# Altium footprint library cat.PcbLib: 78 footprints (part 1 of 5)
Each footprint in its own frame and in the unit in brackets; x right, y up, seen from the top. Pads: shape width x height; smd on the part's side, far side on the other; paste and mask are expansions set on the pad; w line width, h text height; cw(c..) or ccw(c..) is an arc to the next point about the centre after c.
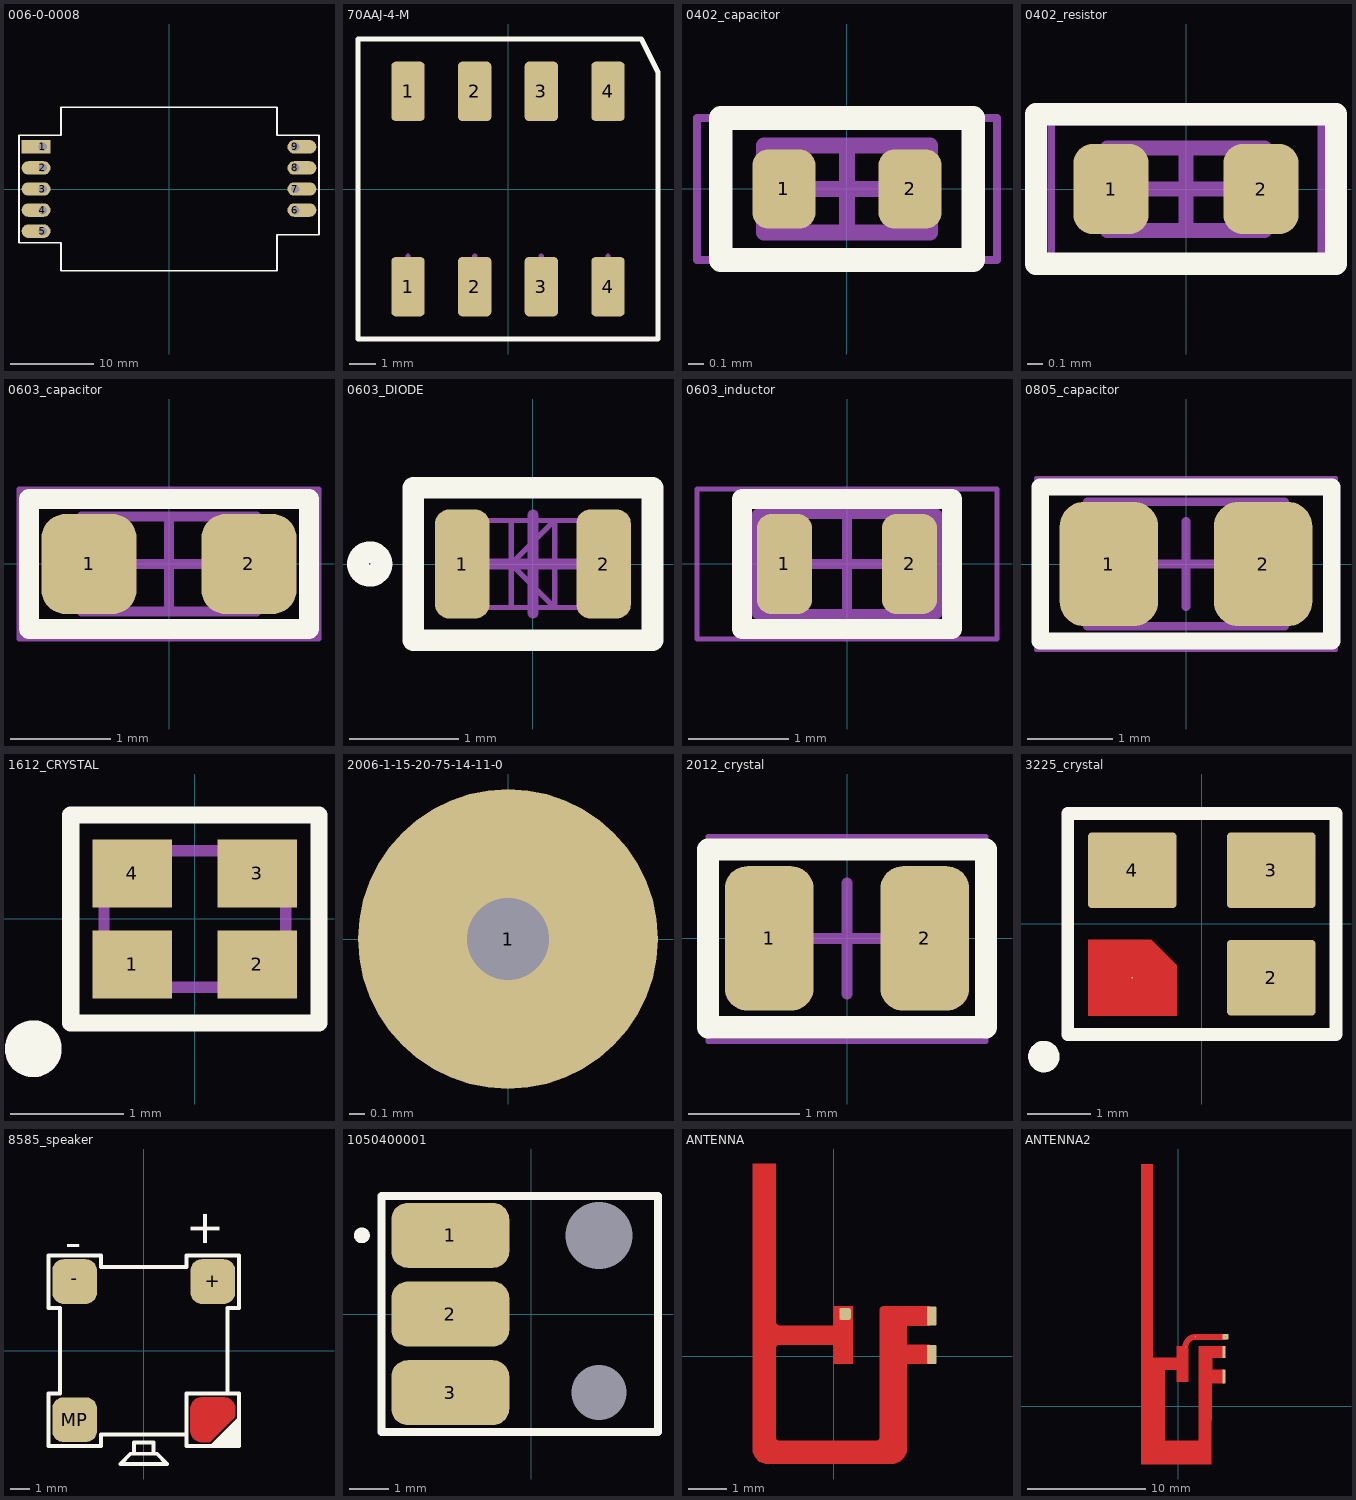
[diagram p0: the footprints below, top view; thin cyan lines are the x and y axes]

## 006-0-0008 [mm] "Sunrise CO2 sensor"
pads (9):
  rect 3.5x1.62 hole 1.02 copper offset -0.8,0: 1(-15.24,5.08)
  oval 3.5x1.62 hole 1.02 copper offset -0.8,0: 2(-15.24,2.54) 3(-15.24,0) 4(-15.24,-2.54) 5(-15.24,-5.08)
  oval 3.5x1.62 hole 1.02 copper offset 0.8,0: 6(15.24,-2.54) 7(15.24,0) 8(15.24,2.54) 9(15.24,5.08)
Top Overlay:
  lines w0.2: -18.1,-6.5 -18.1,6.5 -13.025,6.5 -13.025,9.85 13.025,9.85 13.025,6.5 18.1,6.5 18.1,-5.5 13.025,-5.5 13.025,-9.85 -13.025,-9.85 -13.025,-6.5 -18.1,-6.5
3D body "006-0-0008_co2_sensor.step": height 14.02, standoff 2.54, extent -17.04,-9.852 16.5,9.853
3D body "4-pin_header.step": height 9.95, standoff -1.59, extent 13.97,-3.81 16.51,6.35
3D body "5-pin_header.step": height 9.95, standoff -1.59, extent -16.51,-6.35 -13.97,6.35

## 70AAJ-4-M [mm]
pads (8):
  rrect25% 1.27x2.26 smd: 1(-3.81,-3.72) 1(-3.81,3.72) 2(-1.27,-3.72) 2(-1.27,3.72) 3(1.27,-3.72) 3(1.27,3.72) 4(3.81,-3.72) 4(3.81,3.72)
Top Overlay:
  lines w0.2: -5.715,-5.715 5.715,-5.715 5.715,4.445 5.08,5.715 -5.715,5.715 -5.715,-5.715
Mechanical 15:
  lines w0.2: -4.31,-3.048 -3.31,-3.048 ; -3.81,-3.548 -3.81,-2.548 ; -1.77,-3.048 -0.77,-3.048 ; -1.27,-3.548 -1.27,-2.548 ; 0.77,-3.048 1.77,-3.048 ; 1.27,-3.548 1.27,-2.548 ; 3.31,-3.048 4.31,-3.048 ; 3.81,-3.548 3.81,-2.548
3D body "70aaj-4-m0.stp": height 4.03, standoff 0.05, extent -5.042,-4.224 5.042,4.26

## 0402_capacitor [mm] "0402 chip capacitor"
height 0.55
pads (2):
  rrect50% 0.4x0.5 smd: 1(-0.4,0) 2(0.4,0)
Top Overlay:
  lines w0.15: -0.8,-0.45 -0.8,0.45 0.8,0.45 0.8,-0.45 -0.8,-0.45
Mechanical 13:
  lines w0.1: -0.525,-0.275 -0.525,0.275 0.525,0.275 0.525,-0.275 -0.525,-0.275
Mechanical 15:
  lines w0.05: -0.95,-0.45 -0.95,0.45 0.95,0.45 0.95,-0.45 -0.95,-0.45
  lines w0.1: -0.275,0 0.275,0 ; 0,-0.275 0,0.275
3D body "0402_capacitor.step": height 0.55, standoff 0, extent -0.525,-0.275 0.525,0.275

## 0402_resistor [mm] "Chip Resistor, 2-Leads, Body 1.00x0.50mm, IPC Medium Density"
height 0.4
pads (2):
  rrect50% 0.5x0.6 smd: 1(-0.5,0) 2(0.5,0)
Top Overlay:
  lines w0.15: -1,-0.5 -1,0.5 1,0.5 1,-0.5 -1,-0.5
Mechanical 13:
  lines w0.1: -0.525,-0.275 0.525,-0.275 0.525,0.275 -0.525,0.275 -0.525,-0.275
Mechanical 15:
  lines w0.05: -0.9,-0.45 0.9,-0.45 0.9,0.45 -0.9,0.45 -0.9,-0.45
  lines w0.1: -0.275,0 0.275,0 ; 0,-0.275 0,0.275
3D body "0402_resistor_fix.step": height 0.4, standoff 0, extent -0.525,-0.275 0.525,0.275

## 0603_capacitor [mm] "Chip Capacitor, 2-Leads, Body 1.60x0.80mm, IPC Medium Density"
height 0.87
pads (2):
  rrect50% 0.95x1 smd: 1(-0.8,0) 2(0.8,0)
Top Overlay:
  lines w0.2: -1.4,-0.65 -1.4,0.65 1.4,0.65 1.4,-0.65 -1.4,-0.65
Mechanical 13:
  lines w0.1: -0.875,-0.475 0.875,-0.475 0.875,0.475 -0.875,0.475 -0.875,-0.475
Mechanical 15:
  lines w0.05: -1.5,-0.75 1.5,-0.75 1.5,0.75 -1.5,0.75 -1.5,-0.75
  lines w0.1: -0.475,0 0.475,0 ; 0,-0.475 0,0.475
3D body "0603_capacitor.step": height 0.87, standoff 0, extent -0.875,-0.475 0.875,0.475

## 0603_DIODE [mm]
height 0.75
pads (2):
  rrect50% 0.5x1 smd: 1(-0.65,0) 2(0.65,0)
Top Overlay:
  circle w0.2: c-1.5,0 r0.108
  lines w0.2: -1.1,-0.7 1.1,-0.7 1.1,0.7 -1.1,0.7 -1.1,-0.7
Top Assembly:
  lines w0.05: -0.2,-0.4 -0.2,0.4 ; -0.8,-0.4 -0.8,0.4 0.8,0.4 0.8,-0.4 -0.8,-0.4 ; -0.2,0 0.2,0.4 0.2,-0.2 0.2,-0.4 -0.2,0
Top Courtyard:
  lines w0.05: -1.1,-0.7 1.1,-0.7 1.1,0.7 -1.1,0.7 -1.1,-0.7
Top Component Center:
  lines w0.1: -0.45,0 0.45,0 ; 0,-0.45 0,0.45
3D body "APT1608.STEP": height 0.74, standoff -0.01, extent -0.806,-0.4 0.805,0.4

## 0603_inductor [mm] "Chip Inductor, 2-Leads, Body 1.60x0.80mm, IPC Medium Density"
height 1
pads (2):
  rrect50% 0.55x1 smd: 1(-0.625,0) 2(0.625,0)
Top Overlay:
  lines w0.2: -1.05,-0.65 -1.05,0.65 1.05,0.65 1.05,-0.65 -1.05,-0.65
Mechanical 13:
  lines w0.1: -0.9,-0.5 0.9,-0.5 0.9,0.5 -0.9,0.5 -0.9,-0.5
Mechanical 15:
  lines w0.05: -1.5,-0.75 1.5,-0.75 1.5,0.75 -1.5,0.75 -1.5,-0.75
  lines w0.1: -0.5,0 0.5,0 ; 0,-0.5 0,0.5
3D body "0603_inductor.step": height 1, standoff 0, extent -0.9,-0.5 0.9,0.5

## 0805_capacitor [mm] "Chip Capacitor, 2-Leads, Body 2.00x1.25mm, IPC Medium Density"
height 0.95
pads (2):
  rrect50% 1.15x1.45 smd: 1(-0.9,0) 2(0.9,0)
Top Overlay:
  lines w0.2: -1.7,-0.9 1.7,-0.9 1.7,0.9 -1.7,0.9 -1.7,-0.9
Mechanical 13:
  lines w0.1: -1.15,-0.725 -1.15,0.725 1.15,0.725 1.15,-0.725 -1.15,-0.725
Mechanical 15:
  lines w0.05: -1.75,-1 -1.75,1 1.75,1 1.75,-1 -1.75,-1
  lines w0.1: -0.5,0 0.5,0 ; 0,-0.5 0,0.5
3D body "0805_capacitor.step": height 0.95, standoff 0, extent -1.15,-0.725 1.15,0.725

## 1612_CRYSTAL [mm] "Crystal 1.6 x 1.2 mm"
height 0.4
pads (4):
  rect 0.7x0.6 smd: 1(-0.55,-0.4) 2(0.55,-0.4) 3(0.55,0.4) 4(-0.55,0.4)
Top Overlay:
  circle w0.25: c-1.422,-1.143 r0.125
  lines w0.15: -1.092,-0.914 1.092,-0.914 1.092,0.914 -1.092,0.914 -1.092,-0.914
Bottom Courtyard:
  lines w0.1: -0.8,-0.6 0.8,-0.6 0.8,0.6 -0.8,0.6 -0.8,-0.6
3D body: height 0.41, standoff 0.15, extent -0.7,-0.513 0.7,0.512
3D body "User Library-Siward_AX1612.step": height 0.41, standoff 0, extent -0.83,-0.629 0.83,0.629

## 2006-1-15-20-75-14-11-0 [mm] "Pogo Pin"
pads (1):
  round 2 hole 0.55: 1(0,0)
3D body "mill-max-2006-1-15-20-XX-14-11-0.step": height 4.5, standoff -1.75, extent -0.914,-0.908 0.914,0.908

## 2012_crystal [mm] "2.0 × 1.2 × 0.6 mm Crystal"
height 0.6
pads (2):
  rrect50% 0.8x1.3 smd paste-0.1: 1(-0.7,0) 2(0.7,0)
Top Overlay:
  lines w0.2: -1.25,-0.8 1.25,-0.8 1.25,0.8 -1.25,0.8 -1.25,-0.8
Mechanical 13:
  lines w0.1: -1.25,-0.8 -1.25,0.8 1.25,0.8 1.25,-0.8 -1.25,-0.8
Mechanical 15:
  lines w0.05: -1.25,-0.924 -1.25,0.914 1.25,0.914 1.25,-0.924 -1.25,-0.924
  lines w0.1: -0.5,0 0.5,0 ; 0,-0.5 0,0.5
3D body: height 0.6, standoff 0, extent -1,-0.6 1,0.6

## 3225_crystal [mm]
pads (4):
  round 0.025 smd: 1(-1.1,-0.85)
  rrect10% 1.4x1.2 smd: 2(1.1,-0.85) 3(1.1,0.85) 4(-1.1,0.85)
Top Layer:
  region: -1.8,-1.45 -1.8,-0.25 -1.4,-0.25 -0.8,-0.25 -0.4,-0.65 -0.4,-1.45
Top Overlay:
  circle w0.25: c-2.5,-2.1 r0.125
  lines w0.2: -2.125,-1.75 2.125,-1.75 2.125,1.75 -2.125,1.75 -2.125,-1.75
3D body: height 0.8, standoff 0, extent -1.6,-1.25 1.6,1.25

## 8585_speaker [mm]
pads (4):
  rrect50% 2.3x2.3 smd: +(3.55,3.55) -(-3.55,3.55) MP(-3.55,-3.55)
  round 0.025 smd: MP(3.55,-3.55)
Top Layer:
  region: 4.125,-2.4 4.163,-2.4 4.237,-2.41 4.31,-2.429 4.38,-2.458 4.445,-2.496 4.505,-2.542 4.558,-2.595 4.604,-2.655 4.642,-2.72 4.671,-2.79 4.69,-2.863 4.7,-2.937 4.7,-2.975 4.7,-3.4 3.4,-4.7 2.975,-4.7 2.937,-4.7 2.863,-4.69 2.79,-4.671 2.72,-4.642 2.655,-4.604 2.595,-4.558 2.542,-4.505 2.496,-4.445 2.458,-4.38 2.429,-4.31 2.41,-4.237 2.4,-4.163 2.4,-4.125 2.4,-2.975 2.4,-2.937 2.41,-2.863 2.429,-2.79 2.458,-2.72 2.496,-2.655 2.542,-2.595 2.595,-2.542 2.655,-2.496 2.72,-2.458 2.79,-2.429 2.863,-2.41 2.937,-2.4 2.975,-2.4
Top Overlay:
  region: 4.9,-3.6 3.6,-4.9 4.9,-4.9
  lines w0.2: -0.5,-5.3 -0.675,-5.3 -1.2,-5.825 1.2,-5.825 0.675,-5.3 0.5,-5.3 ; -0.5,-5.3 -0.5,-4.725 0.5,-4.725 0.5,-5.3 ; -0.5,-5.3 0.5,-5.3 ; 2.2,-4.3 2.2,-4.9 4.9,-4.9 ; 2.2,-4.3 -2.2,-4.3 -2.2,-4.9 -4.9,-4.9 -4.9,-2.2 -4.3,-2.2 -4.3,2.2 -4.9,2.2 -4.9,4.9 -2.2,4.9 -2.2,4.3 2.2,4.3 2.2,4.9 4.9,4.9 4.9,2.2 4.3,2.2 4.3,-2.2 ; 2.2,-4.3 2.2,-2.2 4.3,-2.2 ; 4.3,-2.2 4.9,-2.2 4.9,-4.9 ; 4.9,-4.9 3.5,-4.9 4.9,-3.5 4.9,-4.9
  text "-" at -3.188,6.595 h3
  text "+" at 4.495,5.267 h3
3D body: height 3, standoff 0, extent -4.3,-4.3 4.3,4.3

## 1050400001 [mm] "3-Pin spring connector"
pads (5):
  rrect50% 3x1.65 smd: 1(-2.05,2) 2(-2.05,0) 3(-2.05,-2)
  rrect50% 0x0 hole 1.7 unplated: ""(1.73,2)
  rrect50% 0x0 hole 1.4 unplated: ""(1.73,-2)
Top Overlay:
  circle w0.2: c-4.3,2 r0.1
  lines w0.2: -3.8,-3 3.23,-3 3.23,3 -3.8,3 -3.8,-3
3D body "1050400001_spring_connector.step": height 4.92, standoff -2.19, extent -3.23,-3 3.23,3

## ANTENNA [mm]
pads (3):
  rrect25% 0.3x0.3 smd mask+0: FEED(0.3,1.1)
  rrect25% 0.25x0.5 smd mask+0: PLANE(2.55,0.05) PLANE(2.55,1.05)
Top Layer:
  region: -2.1,-2.4 -2.1,-2.48 -2.039,-2.627 -1.927,-2.739 -1.78,-2.8 -1.7,-2.8 1.5,-2.8 1.58,-2.8 1.727,-2.739 1.839,-2.627 1.9,-2.48 1.9,-2.4 1.9,-0.2 2.5,-0.2 2.5,0.3 1.9,0.3 1.9,0.8 2.5,0.8 2.5,1.3 1.3,1.3 1.28,1.3 1.243,1.285 1.215,1.257 1.2,1.22 1.2,1.2 1.2,-2.1 1.198,-2.12 1.183,-2.156 1.156,-2.183 1.119,-2.198 1.1,-2.2 -1.4,-2.2 -1.42,-2.198 -1.456,-2.183 -1.483,-2.156 -1.498,-2.12 -1.5,-2.1 -1.5,0.2 -1.498,0.22 -1.483,0.256 -1.456,0.283 -1.42,0.298 -1.4,0.3 0,0.3 0,-0.2 0.5,-0.2 0.5,1.3 0,1.3 0,0.8 -1.4,0.8 -1.42,0.802 -1.456,0.817 -1.483,0.844 -1.498,0.88 -1.5,0.9 -1.5,5 -2.1,5
Top Solder:
  region: -2.1,-2.4 -2.1,-2.48 -2.039,-2.627 -1.927,-2.739 -1.78,-2.8 -1.7,-2.8 1.5,-2.8 1.58,-2.8 1.727,-2.739 1.839,-2.627 1.9,-2.48 1.9,-2.4 1.9,-0.2 2.5,-0.2 2.5,0.3 1.9,0.3 1.9,0.8 2.5,0.8 2.5,1.3 1.3,1.3 1.28,1.3 1.243,1.285 1.215,1.257 1.2,1.22 1.2,1.2 1.2,-2.1 1.198,-2.12 1.183,-2.156 1.156,-2.183 1.119,-2.198 1.1,-2.2 -1.4,-2.2 -1.42,-2.198 -1.456,-2.183 -1.483,-2.156 -1.498,-2.12 -1.5,-2.1 -1.5,0.2 -1.498,0.22 -1.483,0.256 -1.456,0.283 -1.42,0.298 -1.4,0.3 0,0.3 0,-0.2 0.5,-0.2 0.5,1.3 0,1.3 0,0.8 -1.4,0.8 -1.42,0.802 -1.456,0.817 -1.483,0.844 -1.498,0.88 -1.5,0.9 -1.5,5 -2.1,5

## ANTENNA2 [mil]
pads (7):
  round 0.5 on Top hole 0.5: 1(24.73,198.11) 1(58.34,231.72) 1(58.34,231.72) 1(157.6,231.72)
  rrect25% 19.68x19.68 smd mask+0: FEED(157.6,231.97)
  rrect25% 9.84x47.24 smd mask+0: PLANE(152.6,99.35)
  rrect25% 9.84x39.37 smd mask+0: PLANE(152.6,181.03)
Top Layer:
  region: -4.88,82.61 -4.88,121.98 -44.25,121.98 -44.25,-114.24 68.6,-114.24 68.6,200.72 152.6,200.72 152.6,161.35 113.23,161.35 113.23,121.98 152.6,121.98 152.6,76.72 111.6,76.72 110.6,-171.28 110.6,-192.28 -123.4,-192.28 -123.4,807.72 -83.62,807.72 -83.62,161.35 -4.88,161.35 -4.88,200.72 34.49,200.72 34.49,82.61
  lines w19.68: 24.55,197.93 cw(c58.33,197.93) 58.33,231.72 58.59,231.72 157.35,231.72